# Altium footprint library connectors.PcbLib: 98 footprints (part 6 of 7)
Each footprint in its own frame and in the unit in brackets; x right, y up, seen from the top. Pads: shape width x height; smd on the part's side, far side on the other; paste and mask are expansions set on the pad; w line width, h text height; cw(c..) or ccw(c..) is an arc to the next point about the centre after c.
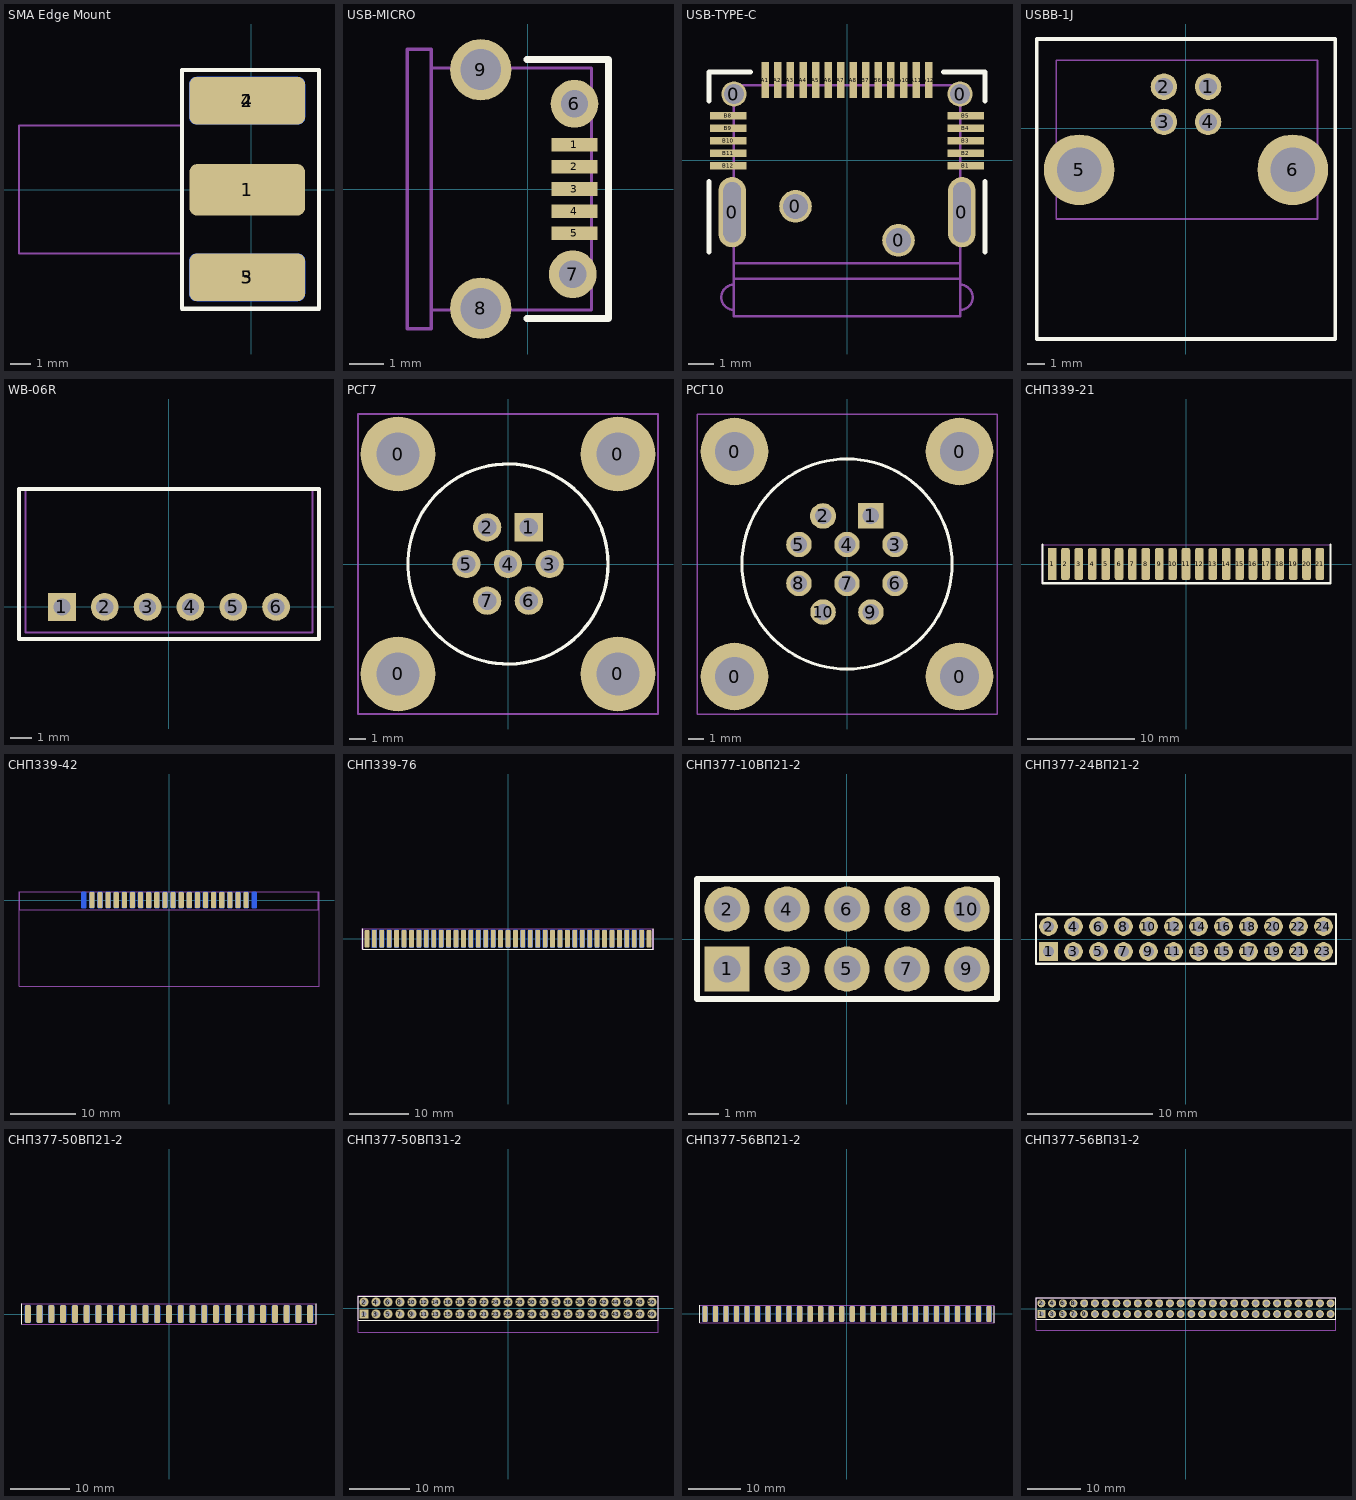
[diagram p5: the footprints below, top view; thin cyan lines are the x and y axes]

## SMA Edge Mount [mm]
pads (5):
  rrect30% 5.6x2.5 smd: 1(-0.2,0)
  rrect30% 5.6x2.3 smd: 2(-0.2,4.32) 3(-0.2,-4.23)
  rrect30% 5.6x2.3 smd far side: 4(-0.2,4.32) 5(-0.2,-4.23)
Top Overlay:
  lines w0.2: -3.35,-5.75 -3.35,5.8 3.275,5.8 3.275,-5.75 -3.35,-5.75
Top Assy:
  lines w0.1: -11.25,-3.075 -11.25,3.125 -3.35,3.125 -3.35,5.8 3.275,5.8 3.275,-5.75 -3.35,-5.75 -3.35,-3.075 -11.25,-3.075
Top Cortyard:
  lines w0.05: -11.25,-3.075 -3.35,-3.075 -3.35,-5.75 3.275,-5.75 3.275,5.8 -3.35,5.8 -3.35,3.125 -11.25,3.125 -11.25,-3.075
3D body "732511150.stp": height 4.96, standoff -2.96, extent -13.1,-4.762 1.175,4.763

## USB-MICRO [mm]
pads (9):
  rect 1.35x0.4 smd: 1(1.375,1.3) 2(1.375,0.65) 3(1.375,0) 4(1.375,-0.65) 5(1.375,-1.3)
  round 1.4 hole 0.8: 6(1.375,2.5) 7(1.325,-2.5)
  round 1.8 hole 1.2: 8(-1.375,-3.5) 9(-1.375,3.5)
Top Overlay:
  lines w0.2: -0.025,-3.8 2.375,-3.8 2.375,3.8 -0.025,3.8
Top Assy:
  lines w0.1: -2.825,-3.55 1.875,-3.55 1.875,3.55 -2.825,3.55 ; -3.525,-4.1 -3.525,4.1 -2.825,4.1 -2.825,-4.1 -3.525,-4.1

## USB-TYPE-C [mm]
pads (30):
  oval 1.1x2.8 hole 0.7 slot 2.4 at 90 deg: 0(-4.57,-2.07) 0(4.57,-2.07)
  round 1 hole 0.8: 0(-4.5,2.63) 0(4.5,2.63)
  round 1.3 hole 1: 0(-2.05,-1.84) 0(2.05,-3.19)
  rect 0.3x1.45 smd: A1(-3.25,3.19) A2(-2.75,3.19) A3(-2.25,3.19) A4(-1.75,3.19) A5(-1.25,3.19) A6(-0.75,3.19) A7(-0.25,3.19) A8(0.25,3.19) A9(1.75,3.19) A10(2.25,3.19) A11(2.75,3.19) A12(3.25,3.19) B6(1.25,3.19) B7(0.75,3.19)
  rect 1.45x0.3 smd: B1(4.725,-0.23) B2(4.725,0.27) B3(4.725,0.77) B4(4.725,1.27) B5(4.725,1.77) B8(-4.725,1.77) B9(-4.725,1.27) B10(-4.725,0.77) B11(-4.725,0.27) B12(-4.725,-0.23)
Top Overlay:
  lines w0.2: -5.5,-3.65 -5.5,-0.85 ; -5.5,2.35 -5.5,3.5 -3.85,3.5 ; 3.85,3.5 5.5,3.5 5.5,2.35 ; 5.5,-3.65 5.5,-0.85
Keep-Out Layer:
  lines w0.1: -4.92,-2.945 ccw(c-4.57,-2.945) -4.22,-2.945 ; -4.92,-2.94 -4.92,-1.195 cw(c-4.57,-1.195) -4.22,-1.195 -4.22,-2.94 ; 4.22,-2.945 ccw(c4.57,-2.945) 4.92,-2.945 ; 4.22,-2.94 4.22,-1.195 cw(c4.57,-1.195) 4.92,-1.195 4.92,-2.94
Top Assy:
  lines w0.1: -4.5,-5.96 cw(c-4.5,-5.46) -4.5,-4.96 ; -4.5,-4.71 4.5,-4.71 ; -4.5,-4.11 4.5,-4.11 ; 4.5,-5.96 ccw(c4.5,-5.46) 4.5,-4.96 ; -4.5,-6.21 -4.5,2.99 4.5,2.99 4.5,-6.21 -4.5,-6.21
3D body "24pin_WP_180509.STEP": height 4.04, standoff -1.51, extent -5.3,-6.19 5.308,3.29

## USBB-1J [mm]
height 11.2
pads (6):
  round 1.5 hole 1: 1(1.25,2.355) 2(-1.25,2.355) 3(-1.25,0.355) 4(1.25,0.355)
  round 4 hole 2.5: 5(-6.05,-2.355) 6(6.05,-2.355)
Top Overlay:
  lines w0.2: -8.45,-11.945 -8.45,5.055 8.45,5.055 8.45,-11.945 -8.45,-11.945
Top Assy:
  lines w0.1: -7.349,-5.145 7.45,-5.145 7.45,3.855 -7.349,3.855 -7.349,-5.145
Top Cortyard:
  lines w0.05: -8.45,-11.945 8.45,-11.945 8.45,5.055 -8.45,5.055 -8.45,-11.945
3D body "User Library-Samtec - USB-B-S-X-W-TH.STEP": height 11, standoff -3.64, extent -7.349,-12.645 7.447,3.855

## WB-06R [mm]
height 5
pads (6):
  rect 1.3x1.3 hole 0.8: 1(-5,0)
  round 1.3 hole 0.8: 2(-3,0) 3(-1,0) 4(1,0) 5(3,0) 6(5,0)
Top Overlay:
  lines w0.2: -7,-1.5 -7,5.5 7,5.5 7,-1.5 -7,-1.5
Top Assy:
  lines w0.1: -6.7,-1.2 -6.7,5.5 6.7,5.5 6.7,-1.2 -6.7,-1.2
Top Cortyard:
  lines w0.05: -7,-1.5 7,-1.5 7,5.5 -7,5.5 -7,-1.5

## РСГ7 [mm]
pads (11):
  round 4.5 hole 2.6: 0(-6.6,-6.6) 0(-6.6,6.6) 0(6.6,-6.6) 0(6.6,6.6)
  rect 1.7x1.7 hole 1.1: 1(1.25,2.2)
  round 1.7 hole 1.1: 2(-1.25,2.2) 3(2.5,0) 4(0,0) 5(-2.5,0) 6(1.25,-2.2) 7(-1.25,-2.2)
Top Overlay:
  circle w0.2: c0,0 r6
Top Assy:
  lines w0.1: -9,-9 9,-9 9,9 -9,9 -9,-9
Top Cortyard:
  lines w0.05: -9,-9 -9,9 9,9 9,-9 -9,-9

## РСГ10 [mm]
pads (14):
  round 4.5 hole 2.6: 0(-7.5,-7.5) 0(-7.5,7.5) 0(7.5,7.5)
  round 4.5 / inner round 4 / far side round 4.5 hole 2.6: 0(7.5,-7.5)
  rect 1.7x1.7 hole 1.1: 1(1.6,3.2)
  oval 1.73x1.7 hole 1.1: 2(-1.6,3.2)
  round 1.7 hole 1.1: 3(3.2,1.3) 4(0,1.3) 5(-3.2,1.3) 6(3.2,-1.3) 7(0,-1.3) 8(-3.2,-1.3) 9(1.6,-3.2) 10(-1.6,-3.2)
Top Overlay:
  circle w0.2: c0,0 r7
Top Assy:
  lines w0.1: -10,-10 10,-10 10,10 -10,10 -10,-10
Top Cortyard:
  lines w0.05: -10,-10 -10,10 10,10 10,-10 -10,-10

## СНП339-21 [mm] "Соединитель серии СНП339, 21 вывод"
height 8
pads (21):
  rect 0.8x3 smd: 1(-12.5,0)
  rrect50% 0.8x3 smd: 2(-11.25,0) 3(-10,0) 4(-8.75,0) 5(-7.5,0) 6(-6.25,0) 7(-5,0) 8(-3.75,0) 9(-2.5,0) 10(-1.25,0) 11(0,0) 12(1.25,0) 13(2.5,0) 14(3.75,0) 15(5,0) 16(6.25,0) 17(7.5,0) 18(8.75,0) 19(10,0) 20(11.25,0) 21(12.5,0)
Top Overlay:
  lines w0.2: -13.4,1.8 -13.4,-1.8 13.5,-1.8 13.5,1.8
Top Assy:
  lines w0.1: -13.4,-1.8 13.5,-1.8 13.5,1.8 -13.4,1.8 -13.4,-1.8
Top Cortyard:
  lines w0.05: -13.4,-1.8 13.5,-1.8 13.5,1.8 -13.4,1.8 -13.4,-1.8

## СНП339-42 [mm] "Соединитель серии СНП339, 42 выводов"
height 8
pads (42):
  rrect50% 0.8x2.5 smd: 1(-11.875,0) 2(-10.625,0) 3(-9.375,0) 4(-8.125,0) 5(-6.875,0) 6(-5.625,0) 7(-4.375,0) 8(-3.125,0) 9(-1.875,0) 10(-0.625,0) 11(0.625,0) 12(1.875,0) 13(3.125,0) 14(4.375,0) 15(5.625,0) 16(6.875,0) 17(8.125,0) 18(9.375,0) 19(10.625,0) 20(11.875,0)
  rrect50% 0.8x2.5 smd far side: 21(-13.125,0) 22(-11.875,0) 23(-10.625,0) 24(-9.375,0) 25(-8.125,0) 26(-6.875,0) 27(-5.625,0) 28(-4.375,0) 29(-3.125,0) 30(-1.875,0) 31(-0.625,0) 32(0.625,0) 33(1.875,0) 34(3.125,0) 35(4.375,0) 36(5.625,0) 37(6.875,0) 38(8.125,0) 39(9.375,0) 40(10.625,0) 41(11.875,0) 42(13.125,0)
Top Assy:
  lines w0.1: -23,-1.5 23,-1.5 23,1.25 -23,1.25 -23,-1.5
Top Cortyard:
  lines w0.05: -23.1,-13.3 23.1,-13.3 23.1,-1.9 23.1,1.3 -23.1,1.3 -23.1,-13.3
3D body "Розетка СНП339-42б_планарный.STEP": height 3, standoff -5, extent -23,-13.05 23,1.25

## СНП339-76 [mm] "Соединитель серии СНП339, 76 выводов"
height 8
pads (76):
  rrect5% 0.8x3 smd far side: 1(-22.5,0)
  rrect50% 0.8x3 smd far side: 2(-21.25,0) 3(-20,0) 4(-18.75,0) 5(-17.5,0) 6(-16.25,0) 7(-15,0) 8(-13.75,0) 9(-12.5,0) 10(-11.25,0) 11(-10,0) 12(-8.75,0) 13(-7.5,0) 14(-6.25,0) 15(-5,0) 16(-3.75,0) 17(-2.5,0) 18(-1.25,0) 19(0,0) 20(1.25,0) 21(2.5,0) 22(3.75,0) 23(5,0) 24(6.25,0) 25(7.5,0) 26(8.75,0) 27(10,0) 28(11.25,0) 29(12.5,0) 30(13.75,0) 31(15,0) 32(16.25,0) 33(17.5,0) 34(18.75,0) 35(20,0) 36(21.25,0) 37(22.5,0)
  rrect50% 0.8x3 smd: 38(-23.75,0) 39(-22.5,0) 40(-21.25,0) 41(-20,0) 42(-18.75,0) 43(-17.5,0) 44(-16.25,0) 45(-15,0) 46(-13.75,0) 47(-12.5,0) 48(-11.25,0) 49(-10,0) 50(-8.75,0) 51(-7.5,0) 52(-6.25,0) 53(-5,0) 54(-3.75,0) 55(-2.5,0) 56(-1.25,0) 57(0,0) 58(1.25,0) 59(2.5,0) 60(3.75,0) 61(5,0) 62(6.25,0) 63(7.5,0) 64(8.75,0) 65(10,0) 66(11.25,0) 67(12.5,0) 68(13.75,0) 69(15,0) 70(16.25,0) 71(17.5,0) 72(18.75,0) 73(20,0) 74(21.25,0) 75(22.5,0) 76(23.75,0)
Top Overlay:
  lines w0.2: -24.45,1.7 -24.45,-1.8 24.45,-1.8 24.45,1.7
Top Assy:
  lines w0.1: -24.5,-1.8 -24.5,1.7 24.5,1.7 24.5,-1.8 -24.5,-1.8
Top Cortyard:
  lines w0.05: -24.4,-1.8 24.4,-1.8 24.4,1.7 -24.4,1.7 -24.4,-1.8

## СНП377-10ВП21-2 [mm] "Вилка серии СНП377, прямая, двухрядная, 10 выводов"
height 2
pads (10):
  rect 1.5x1.5 hole 0.9: 1(-4,-1)
  round 1.5 hole 0.9: 2(-4,1) 3(-2,-1) 4(-2,1) 5(0,-1) 6(0,1) 7(2,-1) 8(2,1) 9(4,-1) 10(4,1)
Top Overlay:
  lines w0.2: -5,-2 -5,2 5,2 5,-2 -5,-2
Top Assy:
  circle w0.4: c-4.1,-1.1 r0.2
  lines w0.1: -5,-2 -5,2 5,2 5,-2 -5,-2
Top Cortyard:
  lines w0.05: -5,-2 5,-2 5,2 -5,2 -5,-2

## СНП377-24ВП21-2 [mm] "Вилка серии СНП377, прямая, двухрядная, 24 вывода"
height 2
pads (24):
  rect 1.5x1.5 hole 0.9: 1(-11,-1)
  round 1.5 hole 0.9: 2(-11,1) 3(-9,-1) 4(-9,1) 5(-7,-1) 6(-7,1) 7(-5,-1) 8(-5,1) 9(-3,-1) 10(-3,1) 11(-1,-1) 12(-1,1) 13(1,-1) 14(1,1) 15(3,-1) 16(3,1) 17(5,-1) 18(5,1) 19(7,-1) 20(7,1) 21(9,-1) 22(9,1) 23(11,-1) 24(11,1)
Top Overlay:
  lines w0.2: -12,-2 -12,2 12,2 12,-2 -12,-2
Top Assy:
  circle w0.4: c-11.1,-1.1 r0.2
  lines w0.1: -12,-2 -12,2 12,2 12,-2 -12,-2
Top Cortyard:
  lines w0.05: -12,-2 -12,2 12,2 12,-2 -12,-2

## СНП377-50ВП21-2 [mm] "Вилка серии СНП377, двухрядная, 50 выводов, торцевая"
height 5.5
pads (50):
  rrect50% 1x3 smd: 1(-24,0) 3(-22,0) 5(-20,0) 7(-18,0) 9(-16,0) 11(-14,0) 13(-12,0) 15(-10,0) 17(-8,0) 19(-6,0) 21(-4,0) 23(-2,0) 25(0,0) 27(2,0) 29(4,0) 31(6,0) 33(8,0) 35(10,0) 37(12,0) 39(14,0) 41(16,0) 43(18,0) 45(20,0) 47(22,0) 49(24,0)
  rrect50% 1x3 smd far side: 2(-24,0) 4(-22,0) 6(-20,0) 8(-18,0) 10(-16,0) 12(-14,0) 14(-12,0) 16(-10,0) 18(-8,0) 20(-6,0) 22(-4,0) 24(-2,0) 26(0,0) 28(2,0) 30(4,0) 32(6,0) 34(8,0) 36(10,0) 38(12,0) 40(14,0) 42(16,0) 44(18,0) 46(20,0) 48(22,0) 50(24,0)
Top Overlay:
  lines w0.2: -25,-1.7 -25,1.7 ; 25,-1.7 25,1.7
Bottom Overlay:
  lines w0.2: -25,-1.7 -25,1.5 ; 25,-1.7 25,1.7
Top Assy:
  lines w0.1: -25,-1.7 -25,1.7 25,1.7 25,-1.7 -25,-1.7
Top Cortyard:
  lines w0.05: -25,-1.7 -25,1.7 25,1.7 25,-1.7 -25,-1.7

## СНП377-50ВП31-2 [mm] "Вилка серии СНП377, угловая, двухрядная, 50 выводов"
height 4
pads (50):
  rect 1.5x1.5 hole 0.9: 1(-24,-1)
  round 1.5 hole 0.9: 2(-24,1) 3(-22,-1) 4(-22,1) 5(-20,-1) 6(-20,1) 7(-18,-1) 8(-18,1) 9(-16,-1) 10(-16,1) 11(-14,-1) 12(-14,1) 13(-12,-1) 14(-12,1) 15(-10,-1) 16(-10,1) 17(-8,-1) 18(-8,1) 19(-6,-1) 20(-6,1) 21(-4,-1) 22(-4,1) 23(-2,-1) 24(-2,1) 25(0,-1) 26(0,1) 27(2,-1) 28(2,1) 29(4,-1) 30(4,1) 31(6,-1) 32(6,1) 33(8,-1) 34(8,1) 35(10,-1) 36(10,1) 37(12,-1) 38(12,1) 39(14,-1) 40(14,1) 41(16,-1) 42(16,1) 43(18,-1) 44(18,1) 45(20,-1) 46(20,1) 47(22,-1) 48(22,1) 49(24,-1) 50(24,1)
Top Overlay:
  lines w0.2: -25,-2 -25,2 25,2 25,-2 -25,-2
Top Assy:
  circle w0.4: c-24.1,-1.1 r0.2
  lines w0.1: -25,-2 25,-2 25,2 -25,2 -25,-2
Top Cortyard:
  lines w0.05: -25,-4 -25,2 25,2 25,-4 -25,-4

## СНП377-56ВП21-2 [mm] "Вилка серии СНП377, двухрядная, 56 выводов, торцевая"
height 5.5
pads (56):
  rrect50% 1x3 smd: 1(-27,0) 3(-25,0) 5(-23,0) 7(-21,0) 9(-19,0) 11(-17,0) 13(-15,0) 15(-13,0) 17(-11,0) 19(-9,0) 21(-7,0) 23(-5,0) 25(-3,0) 27(-1,0) 29(1,0) 31(3,0) 33(5,0) 35(7,0) 37(9,0) 39(11,0) 41(13,0) 43(15,0) 45(17,0) 47(19,0) 49(21,0) 51(23,0) 53(25,0) 55(27,0)
  rrect50% 1x3 smd far side: 2(-27,0) 4(-25,0) 6(-23,0) 8(-21,0) 10(-19,0) 12(-17,0) 14(-15,0) 16(-13,0) 18(-11,0) 20(-9,0) 22(-7,0) 24(-5,0) 26(-3,0) 28(-1,0) 30(1,0) 32(3,0) 34(5,0) 36(7,0) 38(9,0) 40(11,0) 42(13,0) 44(15,0) 46(17,0) 48(19,0) 50(21,0) 52(23,0) 54(25,0) 56(27,0)
Top Overlay:
  lines w0.2: -28,-1.7 -28,1.7 ; 28,-1.7 28,1.5
Bottom Overlay:
  lines w0.2: -28,-1.7 -28,1.7 ; 28,-1.7 28,1.5
Top Assy:
  lines w0.1: -28,-1.7 28,-1.7 28,1.7 -28,1.7 -28,-1.7
Top Cortyard:
  lines w0.05: -28,-1.7 -28,1.7 28,1.7 28,-1.7 -28,-1.7

## СНП377-56ВП31-2 [mm] "Вилка серии СНП377, угловая, двухрядная, 56 выводов"
height 4
pads (56):
  rect 1.5x1.5 hole 0.9: 1(-27,-1)
  round 1.5 hole 0.9: 2(-27,1) 3(-25,-1) 4(-25,1) 5(-23,-1) 6(-23,1) 7(-21,-1) 8(-21,1) 9(-19,-1) 10(-19,1) 11(-17,-1) 12(-17,1) 13(-15,-1) 14(-15,1) 15(-13,-1) 16(-13,1) 17(-11,-1) 18(-11,1) 19(-9,-1) 20(-9,1) 21(-7,-1) 22(-7,1) 23(-5,-1) 24(-5,1) 25(-3,-1) 26(-3,1) 27(-1,-1) 28(-1,1) 29(1,-1) 30(1,1) 31(3,-1) 32(3,1) 33(5,-1) 34(5,1) 35(7,-1) 36(7,1) 37(9,-1) 38(9,1) 39(11,-1) 40(11,1) 41(13,-1) 42(13,1) 43(15,-1) 44(15,1) 45(17,-1) 46(17,1) 47(19,-1) 48(19,1) 49(21,-1) 50(21,1) 51(23,-1) 52(23,1) 53(25,-1) 54(25,1) 55(27,-1) 56(27,1)
Top Overlay:
  lines w0.2: -28,-2 -28,2 28,2 28,-2 -28,-2
Top Assy:
  circle w0.4: c-27.1,-1.1 r0.2
  lines w0.1: -28,-2 28,-2 28,2 -28,2 -28,-2
Top Cortyard:
  lines w0.05: -28,-4 28,-4 28,2 -28,2 -28,-4